# Altium footprint library tsl_Pcblib.PcbLib: 219 footprints (part 9 of 14)
Each footprint in its own frame and in the unit in brackets; x right, y up, seen from the top. Pads: shape width x height; smd on the part's side, far side on the other; paste and mask are expansions set on the pad; w line width, h text height; cw(c..) or ccw(c..) is an arc to the next point about the centre after c.
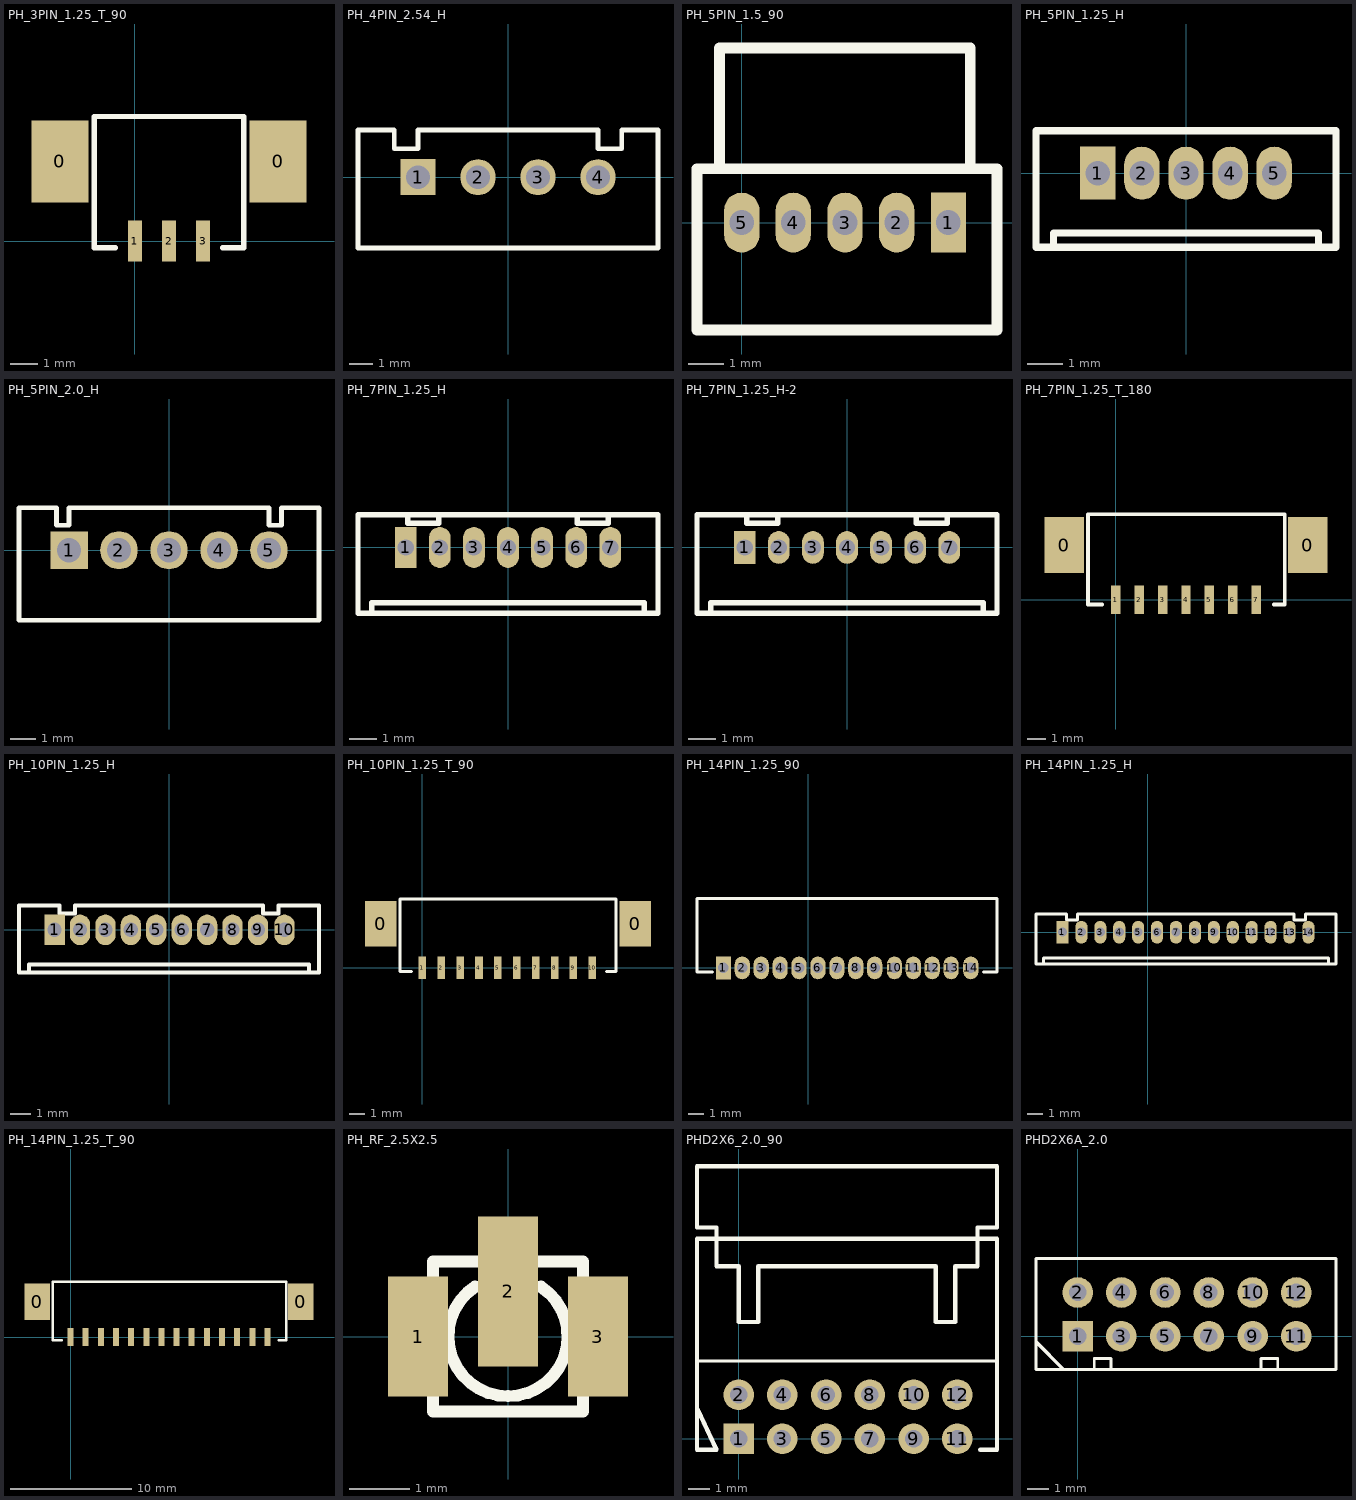
[diagram p8: the footprints below, top view; thin cyan lines are the x and y axes]

## PH_3PIN_1.25_T_90 [mm]
pads (5):
  rect 2.1x3 smd: 0(-2.757,2.921) 0(5.257,2.921)
  rect 0.5x1.5 smd: 1(0,0) 2(1.25,0) 3(2.5,0)
Top Overlay:
  lines w0.2: -0.725,-0.254 -1.487,-0.254 -1.487,4.572 3.937,4.572 ; 3.225,-0.254 3.987,-0.254 3.987,4.572

## PH_4PIN_2.54_H [mm]
pads (4):
  rect 1.5x1.52 / inner rect 1.5x1.52 / far side rect 1.6x1.61 hole 1: 1(-3.81,0)
  oval 1.5x1.52 / inner oval 1.5x1.52 / far side oval 1.6x1.61 hole 1: 2(-1.27,0) 3(1.27,0) 4(3.81,0)
Top Overlay:
  lines w0.2: -6.35,-3 6.35,-3 6.35,2 4.81,2 4.81,1.2 3.81,1.2 3.81,2 -3.81,2 -3.81,1.2 -4.81,1.2 -4.81,2 -6.35,2 -6.35,-3

## PH_5PIN_1.5_90 [mm]
pads (5):
  rect 1x1.7 hole 0.7: 1(5.86,0)
  oval 1x1.7 hole 0.7: 2(4.395,0) 3(2.93,0) 4(1.46,0) 5(0,0)
Top Overlay:
  lines w0.305: -0.635,1.524 -0.635,4.953 6.477,4.953 6.477,1.524 ; -1.27,-3.048 -1.27,1.524 7.239,1.524 7.239,-3.048 -1.27,-3.048

## PH_5PIN_1.25_H [mm]
pads (5):
  rect 1x1.5 hole 0.7: 1(-2.5,0)
  oval 1x1.5 hole 0.7: 2(-1.25,0) 3(0,0) 4(1.25,0) 5(2.5,0)
Top Overlay:
  lines w0.2: -4.25,-2.1 4.25,-2.1 4.25,1.2 -4.25,1.2 -4.25,-2.1 ; -3.75,-2.1 -3.75,-1.7 3.75,-1.7 3.75,-2.1 -3.75,-2.1

## PH_5PIN_2.0_H [mm]
pads (5):
  rect 1.5x1.52 hole 0.96: 1(-4,0)
  oval 1.5x1.52 hole 0.96: 2(-2,0) 3(0,0) 4(2,0) 5(4,0)
Top Overlay:
  lines w0.2: -6,-2.8 -6,1.7 -4.5,1.7 -4.5,1 -4,1 -4,1.7 4,1.7 4,1 4.5,1 4.5,1.7 6,1.7 6,-2.8 -6,-2.8

## PH_7PIN_1.25_H [mm]
pads (7):
  rect 0.8x1.5 hole 0.6: 1(-3.75,0)
  oval 0.8x1.5 hole 0.6: 2(-2.5,0) 3(-1.25,0) 4(0,0) 5(1.25,0) 6(2.5,0) 7(3.75,0)
Top Overlay:
  lines w0.2: -3.683,1.2 -3.683,0.889 -2.54,0.889 -2.54,1.2 ; 2.54,1.2 2.54,0.889 3.683,0.889 3.683,1.2 ; -5.5,-2.413 5.5,-2.413 5.5,1.2 -5.5,1.2 -5.5,-2.413 ; -5,-2.413 -5,-2.032 5,-2.032 5,-2.413 -5,-2.413
3D body "Box Header 1.25mm pitch vertical 7 way.stp": height 4.77, standoff -1.83, extent -5.2,-2.159 5.2,1.241

## PH_7PIN_1.25_H-2 [mm]
pads (7):
  rect 0.8x1.2 hole 0.6: 1(-3.75,0)
  oval 0.8x1.2 hole 0.6: 2(-2.5,0) 3(-1.25,0) 4(0,0) 5(1.25,0) 6(2.5,0) 7(3.75,0)
Top Overlay:
  lines w0.2: -3.683,1.2 -3.683,0.889 -2.54,0.889 -2.54,1.2 ; 2.54,1.2 2.54,0.889 3.683,0.889 3.683,1.2 ; -5.5,-2.413 -5.5,1.2 5.5,1.2 5.5,-2.413 -5.5,-2.413 ; -5,-2.413 5,-2.413 5,-2.032 -5,-2.032 -5,-2.413
3D body "Box Header 1.25mm pitch vertical 7 way.stp": height 4.77, standoff -1.83, extent -5.2,-2.159 5.2,1.241

## PH_7PIN_1.25_T_180 [mm]
pads (9):
  rect 2.1x3 smd: 0(-2.757,2.921) 0(10.257,2.921)
  rect 0.5x1.5 smd: 1(0,0) 2(1.25,0) 3(2.5,0) 4(3.75,0) 5(5,0) 6(6.25,0) 7(7.5,0)
Top Overlay:
  lines w0.2: -0.725,-0.254 -1.487,-0.254 -1.487,4.572 9.017,4.572 9.017,-0.254 8.432,-0.254

## PH_10PIN_1.25_H [mm]
pads (10):
  rect 1x1.5 hole 0.7: 1(-5.625,0)
  oval 1x1.5 hole 0.7: 2(-4.375,0) 3(-3.125,0) 4(-1.875,0) 5(-0.625,0) 6(0.625,0) 7(1.875,0) 8(3.125,0) 9(4.375,0) 10(5.675,0)
Top Overlay:
  lines w0.2: -7.375,-2.1 -7.375,1.2 -5.375,1.2 -5.375,0.8 -4.625,0.8 -4.625,1.2 4.625,1.2 4.625,0.8 5.375,0.8 5.375,1.2 7.375,1.2 7.375,-2.1 -7.375,-2.1 ; -6.875,-2.1 6.875,-2.1 6.875,-1.7 -6.875,-1.7 -6.875,-2.1

## PH_10PIN_1.25_T_90 [mm]
pads (12):
  rect 2.1x3 smd: 0(-2.757,2.921) 0(14.097,2.921)
  rect 0.5x1.5 smd: 1(0,0) 2(1.25,0) 3(2.5,0) 4(3.75,0) 5(5,0) 6(6.25,0) 7(7.5,0) 8(8.75,0) 9(10,0) 10(11.25,0)
Top Overlay:
  lines w0.2: -1.487,4.572 -1.487,-0.254 -0.725,-0.254 ; 12.182,-0.254 12.817,-0.254 12.817,4.572
  lines w0.203: -1.487,4.572 12.817,4.572

## PH_14PIN_1.25_90 [mm]
pads (14):
  rect 1x1.5 hole 0.7: 1(-5.625,0)
  oval 1x1.5 hole 0.7: 2(-4.375,0) 3(-3.125,0) 4(-1.875,0) 5(-0.625,0) 6(0.625,0) 7(1.875,0) 8(3.125,0) 9(4.375,0) 10(5.675,0) 11(6.925,0) 12(8.175,0) 13(9.425,0) 14(10.725,0)
Top Overlay:
  lines w0.2: -6.35,-0.254 -7.366,-0.254 -7.366,4.572 12.455,4.572 12.455,-0.254 11.557,-0.254

## PH_14PIN_1.25_H [mm]
pads (14):
  rect 0.8x1.5 hole 0.6: 1(-5.625,0)
  oval 0.8x1.5 hole 0.6: 2(-4.375,0) 3(-3.125,0) 4(-1.875,0) 5(-0.625,0) 6(0.625,0) 7(1.875,0) 8(3.125,0) 9(4.375,0) 10(5.625,0) 11(6.875,0) 12(8.125,0) 13(9.375,0) 14(10.625,0)
Top Overlay:
  lines w0.2: 12.425,1.2 10.425,1.2 10.425,0.8 9.675,0.8 9.675,1.2 4.625,1.2 -4.625,1.2 -4.625,0.8 -5.375,0.8 -5.375,1.2 -7.375,1.2 -7.375,-2.1 12.446,-2.1 12.446,1.2 ; -6.875,-2.1 -6.875,-1.7 11.938,-1.7 11.938,-2.1 -6.875,-2.1
3D body "Box Header 1.25mm pitch vertical 14 way.stp": height 4.77, standoff -1.83, extent -7.085,-2.208 12.065,1.192

## PH_14PIN_1.25_T_90 [mm]
pads (16):
  rect 2.1x3 smd: 0(-2.757,2.921) 0(19.007,2.921)
  rect 0.5x1.5 smd: 1(0,0) 2(1.25,0) 3(2.5,0) 4(3.75,0) 5(5,0) 6(6.25,0) 7(7.5,0) 8(8.75,0) 9(10,0) 10(11.25,0) 11(12.5,0) 12(13.75,0) 13(15,0) 14(16.25,0)
Top Overlay:
  lines w0.2: -0.725,-0.254 -1.487,-0.254 -1.487,4.572 17.817,4.572 17.817,-0.254 17.182,-0.254
3D body "Header 1.25mm pitch SMT RA tin 14 way.stp": height 3.48, standoff -0.12, extent -2.947,-0.635 19.203,5.865

## PH_RF_2.5X2.5 [mm]
pads (3):
  rect 1x2 smd: 1(-1.5,0) 3(1.5,0)
  rect 1x2.5 smd: 2(0,0.75)
Top Overlay:
  lines w0.2: -0.55,0.83 ccw(c0,0) 0.551,0.829 ; -1.25,-1.25 1.25,-1.25 1.25,1.25 -1.25,1.25 -1.25,-1.25
3D body "IPX Coaxial Connectors (RF).step": height 1.3, standoff 0.02, extent -1.5,-1.3 1.5,1.55

## PHD2X6_2.0_90 [mm]
pads (12):
  rect 1.4x1.4 hole 0.8: 1(0,0)
  round 1.4 hole 0.8: 2(0,2) 3(2,0) 4(2,2) 5(4,0) 6(4,2) 7(6,0) 8(6,2) 9(8,0) 10(8,2) 11(10,0) 12(10,2)
Top Overlay:
  lines w0.127: -1.905,3.556 11.811,3.556
  lines w0.2: -1.905,1.397 -1.016,-0.508 -1.905,-0.508 -1.905,9.144 11.811,9.144 11.811,-0.508 11.049,-0.508 ; 6.35,7.874 9.017,7.874 9.017,5.334 9.906,5.334 9.906,7.874 10.922,7.874 10.922,9.144 10.922,9.652 11.811,9.652 11.811,12.446 -1.905,12.446 -1.905,9.652 -1.016,9.652 -1.016,9.144 -1.016,7.874 0,7.874 0,5.334 0.889,5.334 0.889,7.874 6.731,7.874
Bottom Overlay:
  lines w0.508: -1.524,1.016 11.303,1.016 ; 1.016,-1.016 1.016,3.048 ; 2.984,-1.048 2.984,3.016 ; 4.984,-1.048 4.984,3.016 ; 6.984,-1.048 6.984,3.016 ; 9.016,-1.016 9.016,3.048

## PHD2X6A_2.0 [mm]
pads (12):
  rect 1.4x1.4 hole 0.8: 1(0,0)
  round 1.4 hole 0.8: 2(0,2) 3(2,0) 4(2,2) 5(4,0) 6(4,2) 7(6,0) 8(6,2) 9(8,0) 10(8,2) 11(10,0) 12(10,2)
Top Overlay:
  lines w0.127: 0.762,-1.524 0.762,-1.016 1.524,-1.016 1.524,-1.524 ; 8.382,-1.524 8.382,-1.016 9.144,-1.016 9.144,-1.524 ; 2.176,-1.524 6.176,-1.524 ; 2.176,-1.524 -1.905,-1.524 -1.905,3.556 11.811,3.556 11.811,-1.524 6.176,-1.524 ; 2.176,-1.524 6.176,-1.524
  lines w0.152: -1.905,-0.254 -0.635,-1.524
Bottom Overlay:
  lines w0.508: -1.524,1.016 11.303,1.016 ; 1.016,-1.016 1.016,3.048 ; 2.984,-1.048 2.984,3.016 ; 4.984,-1.048 4.984,3.016 ; 6.984,-1.048 6.984,3.016 ; 9.016,-1.016 9.016,3.048